# Altium footprint library 3.22-杂项.PcbLib: 199 footprints (part 11 of 15) (continued)
## TAPE244-15 [mil] "[ PCBѧϰȺ514746572 ]"
pads (244):
  oval 75x8 smd: 1(-562.5,299.5) 2(-562.5,289.5) 3(-562.5,279.5) 4(-562.5,269.5) 5(-562.5,259.5) 6(-562.5,249.5) 7(-562.5,239.5) 8(-562.5,229.5) 9(-562.5,219.5) 10(-562.5,209.5) 11(-562.5,199.5) 12(-562.5,189.5) 13(-562.5,179.5) 14(-562.5,169.5) 15(-562.5,159.5) 16(-562.5,149.5) 17(-562.5,139.5) 18(-562.5,129.5) 19(-562.5,119.5) 20(-562.5,109.5) 21(-562.5,99.5) 22(-562.5,89.5) 23(-562.5,79.5) 24(-562.5,69.5) 25(-562.5,59.5) 26(-562.5,49.5) 27(-562.5,39.5) 28(-562.5,29.5) 29(-562.5,19.5) 30(-562.5,9.5) 31(-562.5,-0.5) 32(-562.5,-10.5) 33(-562.5,-20.5) 34(-562.5,-30.5) 35(-562.5,-40.5) 36(-562.5,-50.5) 37(-562.5,-60.5) 38(-562.5,-70.5) 39(-562.5,-80.5) 40(-562.5,-90.5) 41(-562.5,-100.5) 42(-562.5,-110.5) 43(-562.5,-120.5) 44(-562.5,-130.5) 45(-562.5,-140.5) 46(-562.5,-150.5) 47(-562.5,-160.5) 48(-562.5,-170.5) 49(-562.5,-180.5) 50(-562.5,-190.5) 51(-562.5,-200.5) 52(-562.5,-210.5) 53(-562.5,-220.5) 54(-562.5,-230.5) 55(-562.5,-240.5) 56(-562.5,-250.5) 57(-562.5,-260.5) 58(-562.5,-270.5) 59(-562.5,-280.5) 60(-562.5,-290.5) 61(-562.5,-300.5) 123(562.5,-300.5) 124(562.5,-290.5) 125(562.5,-280.5) 126(562.5,-270.5) 127(562.5,-260.5) 128(562.5,-250.5) 129(562.5,-240.5) 130(562.5,-230.5) 131(562.5,-220.5) 132(562.5,-210.5) 133(562.5,-200.5) 134(562.5,-190.5) 135(562.5,-180.5) 136(562.5,-170.5) 137(562.5,-160.5) 138(562.5,-150.5) 139(562.5,-140.5) 140(562.5,-130.5) 141(562.5,-120.5) 142(562.5,-110.5) 143(562.5,-100.5) 144(562.5,-90.5) 145(562.5,-80.5) 146(562.5,-70.5) 147(562.5,-60.5) 148(562.5,-50.5) 149(562.5,-40.5) 150(562.5,-30.5) 151(562.5,-20.5) 152(562.5,-10.5) 153(562.5,-0.5) 154(562.5,9.5) 155(562.5,19.5) 156(562.5,29.5) 157(562.5,39.5) 158(562.5,49.5) 159(562.5,59.5) 160(562.5,69.5) 161(562.5,79.5) 162(562.5,89.5) 163(562.5,99.5) 164(562.5,109.5) 165(562.5,119.5) 166(562.5,129.5) 167(562.5,139.5) 168(562.5,149.5) 169(562.5,159.5) 170(562.5,169.5) 171(562.5,179.5) 172(562.5,189.5) 173(562.5,199.5) 174(562.5,209.5) 175(562.5,219.5) 176(562.5,229.5) 177(562.5,239.5) 178(562.5,249.5) 179(562.5,259.5) 180(562.5,269.5) 181(562.5,279.5) 182(562.5,289.5) 183(562.5,299.5)
  oval 8x75 smd: 62(-299.5,-562.5) 63(-289.5,-562.5) 64(-279.5,-562.5) 65(-269.5,-562.5) 66(-259.5,-562.5) 67(-249.5,-562.5) 68(-239.5,-562.5) 69(-229.5,-562.5) 70(-219.5,-562.5) 71(-209.5,-562.5) 72(-199.5,-562.5) 73(-189.5,-562.5) 74(-179.5,-562.5) 75(-169.5,-562.5) 76(-159.5,-562.5) 77(-149.5,-562.5) 78(-139.5,-562.5) 79(-129.5,-562.5) 80(-119.5,-562.5) 81(-109.5,-562.5) 82(-99.5,-562.5) 83(-89.5,-562.5) 84(-79.5,-562.5) 85(-69.5,-562.5) 86(-59.5,-562.5) 87(-49.5,-562.5) 88(-39.5,-562.5) 89(-29.5,-562.5) 90(-19.5,-562.5) 91(-9.5,-562.5) 92(0.5,-562.5) 93(10.5,-562.5) 94(20.5,-562.5) 95(30.5,-562.5) 96(40.5,-562.5) 97(50.5,-562.5) 98(60.5,-562.5) 99(70.5,-562.5) 100(80.5,-562.5) 101(90.5,-562.5) 102(100.5,-562.5) 103(110.5,-562.5) 104(120.5,-562.5) 105(130.5,-562.5) 106(140.5,-562.5) 107(150.5,-562.5) 108(160.5,-562.5) 109(170.5,-562.5) 110(180.5,-562.5) 111(190.5,-562.5) 112(200.5,-562.5) 113(210.5,-562.5) 114(220.5,-562.5) 115(230.5,-562.5) 116(240.5,-562.5) 117(250.5,-562.5) 118(260.5,-562.5) 119(270.5,-562.5) 120(280.5,-562.5) 121(290.5,-562.5) 122(300.5,-562.5) 184(300.5,562.5) 185(290.5,562.5) 186(280.5,562.5) 187(270.5,562.5) 188(260.5,562.5) 189(250.5,562.5) 190(240.5,562.5) 191(230.5,562.5) 192(220.5,562.5) 193(210.5,562.5) 194(200.5,562.5) 195(190.5,562.5) 196(180.5,562.5) 197(170.5,562.5) 198(160.5,562.5) 199(150.5,562.5) 200(140.5,562.5) 201(130.5,562.5) 202(120.5,562.5) 203(110.5,562.5) 204(100.5,562.5) 205(90.5,562.5) 206(80.5,562.5) 207(70.5,562.5) 208(60.5,562.5) 209(50.5,562.5) 210(40.5,562.5) 211(30.5,562.5) 212(20.5,562.5) 213(10.5,562.5) 214(0.5,562.5) 215(-9.5,562.5) 216(-19.5,562.5) 217(-29.5,562.5) 218(-39.5,562.5) 219(-49.5,562.5) 220(-59.5,562.5) 221(-69.5,562.5) 222(-79.5,562.5) 223(-89.5,562.5) 224(-99.5,562.5) 225(-109.5,562.5) 226(-119.5,562.5) 227(-129.5,562.5) 228(-139.5,562.5) 229(-149.5,562.5) 230(-159.5,562.5) 231(-169.5,562.5) 232(-179.5,562.5) 233(-189.5,562.5) 234(-199.5,562.5) 235(-209.5,562.5) 236(-219.5,562.5) 237(-229.5,562.5) 238(-239.5,562.5) 239(-249.5,562.5) 240(-259.5,562.5) 241(-269.5,562.5) 242(-279.5,562.5) 243(-289.5,562.5) 244(-299.5,562.5)

## TAPE244-20 [mil] "[ PCBѧϰȺ514746572 ]"
pads (244):
  oval 75x12 smd: 1(-712.5,599.5) 2(-712.5,579.5) 3(-712.5,559.5) 4(-712.5,539.5) 5(-712.5,519.5) 6(-712.5,499.5) 7(-712.5,479.5) 8(-712.5,459.5) 9(-712.5,439.5) 10(-712.5,419.5) 11(-712.5,399.5) 12(-712.5,379.5) 13(-712.5,359.5) 14(-712.5,339.5) 15(-712.5,319.5) 16(-712.5,299.5) 17(-712.5,279.5) 18(-712.5,259.5) 19(-712.5,239.5) 20(-712.5,219.5) 21(-712.5,199.5) 22(-712.5,179.5) 23(-712.5,159.5) 24(-712.5,139.5) 25(-712.5,119.5) 26(-712.5,99.5) 27(-712.5,79.5) 28(-712.5,59.5) 29(-712.5,39.5) 30(-712.5,19.5) 31(-712.5,-0.5) 32(-712.5,-20.5) 33(-712.5,-40.5) 34(-712.5,-60.5) 35(-712.5,-80.5) 36(-712.5,-100.5) 37(-712.5,-120.5) 38(-712.5,-140.5) 39(-712.5,-160.5) 40(-712.5,-180.5) 41(-712.5,-200.5) 42(-712.5,-220.5) 43(-712.5,-240.5) 44(-712.5,-260.5) 45(-712.5,-280.5) 46(-712.5,-300.5) 47(-712.5,-320.5) 48(-712.5,-340.5) 49(-712.5,-360.5) 50(-712.5,-380.5) 51(-712.5,-400.5) 52(-712.5,-420.5) 53(-712.5,-440.5) 54(-712.5,-460.5) 55(-712.5,-480.5) 56(-712.5,-500.5) 57(-712.5,-520.5) 58(-712.5,-540.5) 59(-712.5,-560.5) 60(-712.5,-580.5) 61(-712.5,-600.5) 123(712.5,-600.5) 124(712.5,-580.5) 125(712.5,-560.5) 126(712.5,-540.5) 127(712.5,-520.5) 128(712.5,-500.5) 129(712.5,-480.5) 130(712.5,-460.5) 131(712.5,-440.5) 132(712.5,-420.5) 133(712.5,-400.5) 134(712.5,-380.5) 135(712.5,-360.5) 136(712.5,-340.5) 137(712.5,-320.5) 138(712.5,-300.5) 139(712.5,-280.5) 140(712.5,-260.5) 141(712.5,-240.5) 142(712.5,-220.5) 143(712.5,-200.5) 144(712.5,-180.5) 145(712.5,-160.5) 146(712.5,-140.5) 147(712.5,-120.5) 148(712.5,-100.5) 149(712.5,-80.5) 150(712.5,-60.5) 151(712.5,-40.5) 152(712.5,-20.5) 153(712.5,-0.5) 154(712.5,19.5) 155(712.5,39.5) 156(712.5,59.5) 157(712.5,79.5) 158(712.5,99.5) 159(712.5,119.5) 160(712.5,139.5) 161(712.5,159.5) 162(712.5,179.5) 163(712.5,199.5) 164(712.5,219.5) 165(712.5,239.5) 166(712.5,259.5) 167(712.5,279.5) 168(712.5,299.5) 169(712.5,319.5) 170(712.5,339.5) 171(712.5,359.5) 172(712.5,379.5) 173(712.5,399.5) 174(712.5,419.5) 175(712.5,439.5) 176(712.5,459.5) 177(712.5,479.5) 178(712.5,499.5) 179(712.5,519.5) 180(712.5,539.5) 181(712.5,559.5) 182(712.5,579.5) 183(712.5,599.5)
  oval 12x75 smd: 62(-599.5,-712.5) 63(-579.5,-712.5) 64(-559.5,-712.5) 65(-539.5,-712.5) 66(-519.5,-712.5) 67(-499.5,-712.5) 68(-479.5,-712.5) 69(-459.5,-712.5) 70(-439.5,-712.5) 71(-419.5,-712.5) 72(-399.5,-712.5) 73(-379.5,-712.5) 74(-359.5,-712.5) 75(-339.5,-712.5) 76(-319.5,-712.5) 77(-299.5,-712.5) 78(-279.5,-712.5) 79(-259.5,-712.5) 80(-239.5,-712.5) 81(-219.5,-712.5) 82(-199.5,-712.5) 83(-179.5,-712.5) 84(-159.5,-712.5) 85(-139.5,-712.5) 86(-119.5,-712.5) 87(-99.5,-712.5) 88(-79.5,-712.5) 89(-59.5,-712.5) 90(-39.5,-712.5) 91(-19.5,-712.5) 92(0.5,-712.5) 93(20.5,-712.5) 94(40.5,-712.5) 95(60.5,-712.5) 96(80.5,-712.5) 97(100.5,-712.5) 98(120.5,-712.5) 99(140.5,-712.5) 100(160.5,-712.5) 101(180.5,-712.5) 102(200.5,-712.5) 103(220.5,-712.5) 104(240.5,-712.5) 105(260.5,-712.5) 106(280.5,-712.5) 107(300.5,-712.5) 108(320.5,-712.5) 109(340.5,-712.5) 110(360.5,-712.5) 111(380.5,-712.5) 112(400.5,-712.5) 113(420.5,-712.5) 114(440.5,-712.5) 115(460.5,-712.5) 116(480.5,-712.5) 117(500.5,-712.5) 118(520.5,-712.5) 119(540.5,-712.5) 120(560.5,-712.5) 121(580.5,-712.5) 122(600.5,-712.5) 184(600.5,712.5) 185(580.5,712.5) 186(560.5,712.5) 187(540.5,712.5) 188(520.5,712.5) 189(500.5,712.5) 190(480.5,712.5) 191(460.5,712.5) 192(440.5,712.5) 193(420.5,712.5) 194(400.5,712.5) 195(380.5,712.5) 196(360.5,712.5) 197(340.5,712.5) 198(320.5,712.5) 199(300.5,712.5) 200(280.5,712.5) 201(260.5,712.5) 202(240.5,712.5) 203(220.5,712.5) 204(200.5,712.5) 205(180.5,712.5) 206(160.5,712.5) 207(140.5,712.5) 208(120.5,712.5) 209(100.5,712.5) 210(80.5,712.5) 211(60.5,712.5) 212(40.5,712.5) 213(20.5,712.5) 214(0.5,712.5) 215(-19.5,712.5) 216(-39.5,712.5) 217(-59.5,712.5) 218(-79.5,712.5) 219(-99.5,712.5) 220(-119.5,712.5) 221(-139.5,712.5) 222(-159.5,712.5) 223(-179.5,712.5) 224(-199.5,712.5) 225(-219.5,712.5) 226(-239.5,712.5) 227(-259.5,712.5) 228(-279.5,712.5) 229(-299.5,712.5) 230(-319.5,712.5) 231(-339.5,712.5) 232(-359.5,712.5) 233(-379.5,712.5) 234(-399.5,712.5) 235(-419.5,712.5) 236(-439.5,712.5) 237(-459.5,712.5) 238(-479.5,712.5) 239(-499.5,712.5) 240(-519.5,712.5) 241(-539.5,712.5) 242(-559.5,712.5) 243(-579.5,712.5) 244(-599.5,712.5)

## TAPE284-10 [mil] "[ PCBѧϰȺ514746572 ]"
pads (284):
  oval 75x5 smd: 1(-462.5,349.5) 2(-462.5,339.5) 3(-462.5,329.5) 4(-462.5,319.5) 5(-462.5,309.5) 6(-462.5,299.5) 7(-462.5,289.5) 8(-462.5,279.5) 9(-462.5,269.5) 10(-462.5,259.5) 11(-462.5,249.5) 12(-462.5,239.5) 13(-462.5,229.5) 14(-462.5,219.5) 15(-462.5,209.5) 16(-462.5,199.5) 17(-462.5,189.5) 18(-462.5,179.5) 19(-462.5,169.5) 20(-462.5,159.5) 21(-462.5,149.5) 22(-462.5,139.5) 23(-462.5,129.5) 24(-462.5,119.5) 25(-462.5,109.5) 26(-462.5,99.5) 27(-462.5,89.5) 28(-462.5,79.5) 29(-462.5,69.5) 30(-462.5,59.5) 31(-462.5,49.5) 32(-462.5,39.5) 33(-462.5,29.5) 34(-462.5,19.5) 35(-462.5,9.5) 36(-462.5,-0.5) 37(-462.5,-10.5) 38(-462.5,-20.5) 39(-462.5,-30.5) 40(-462.5,-40.5) 41(-462.5,-50.5) 42(-462.5,-60.5) 43(-462.5,-70.5) 44(-462.5,-80.5) 45(-462.5,-90.5) 46(-462.5,-100.5) 47(-462.5,-110.5) 48(-462.5,-120.5) 49(-462.5,-130.5) 50(-462.5,-140.5) 51(-462.5,-150.5) 52(-462.5,-160.5) 53(-462.5,-170.5) 54(-462.5,-180.5) 55(-462.5,-190.5) 56(-462.5,-200.5) 57(-462.5,-210.5) 58(-462.5,-220.5) 59(-462.5,-230.5) 60(-462.5,-240.5) 61(-462.5,-250.5) 62(-462.5,-260.5) 63(-462.5,-270.5) 64(-462.5,-280.5) 65(-462.5,-290.5) 66(-462.5,-300.5) 67(-462.5,-310.5) 68(-462.5,-320.5) 69(-462.5,-330.5) 70(-462.5,-340.5) 71(-462.5,-350.5) 143(462.5,-350.5) 144(462.5,-340.5) 145(462.5,-330.5) 146(462.5,-320.5) 147(462.5,-310.5) 148(462.5,-300.5) 149(462.5,-290.5) 150(462.5,-280.5) 151(462.5,-270.5) 152(462.5,-260.5) 153(462.5,-250.5) 154(462.5,-240.5) 155(462.5,-230.5) 156(462.5,-220.5) 157(462.5,-210.5) 158(462.5,-200.5) 159(462.5,-190.5) 160(462.5,-180.5) 161(462.5,-170.5) 162(462.5,-160.5) 163(462.5,-150.5) 164(462.5,-140.5) 165(462.5,-130.5) 166(462.5,-120.5) 167(462.5,-110.5) 168(462.5,-100.5) 169(462.5,-90.5) 170(462.5,-80.5) 171(462.5,-70.5) 172(462.5,-60.5) 173(462.5,-50.5) 174(462.5,-40.5) 175(462.5,-30.5) 176(462.5,-20.5) 177(462.5,-10.5) 178(462.5,-0.5) 179(462.5,9.5) 180(462.5,19.5) 181(462.5,29.5) 182(462.5,39.5) 183(462.5,49.5) 184(462.5,59.5) 185(462.5,69.5) 186(462.5,79.5) 187(462.5,89.5) 188(462.5,99.5) 189(462.5,109.5) 190(462.5,119.5) 191(462.5,129.5) 192(462.5,139.5) 193(462.5,149.5) 194(462.5,159.5) 195(462.5,169.5) 196(462.5,179.5) 197(462.5,189.5) 198(462.5,199.5) 199(462.5,209.5) 200(462.5,219.5) 201(462.5,229.5) 202(462.5,239.5) 203(462.5,249.5) 204(462.5,259.5) 205(462.5,269.5) 206(462.5,279.5) 207(462.5,289.5) 208(462.5,299.5) 209(462.5,309.5) 210(462.5,319.5) 211(462.5,329.5) 212(462.5,339.5) 213(462.5,349.5)
  oval 5x75 smd: 72(-349.5,-462.5) 73(-339.5,-462.5) 74(-329.5,-462.5) 75(-319.5,-462.5) 76(-309.5,-462.5) 77(-299.5,-462.5) 78(-289.5,-462.5) 79(-279.5,-462.5) 80(-269.5,-462.5) 81(-259.5,-462.5) 82(-249.5,-462.5) 83(-239.5,-462.5) 84(-229.5,-462.5) 85(-219.5,-462.5) 86(-209.5,-462.5) 87(-199.5,-462.5) 88(-189.5,-462.5) 89(-179.5,-462.5) 90(-169.5,-462.5) 91(-159.5,-462.5) 92(-149.5,-462.5) 93(-139.5,-462.5) 94(-129.5,-462.5) 95(-119.5,-462.5) 96(-109.5,-462.5) 97(-99.5,-462.5) 98(-89.5,-462.5) 99(-79.5,-462.5) 100(-69.5,-462.5) 101(-59.5,-462.5) 102(-49.5,-462.5) 103(-39.5,-462.5) 104(-29.5,-462.5) 105(-19.5,-462.5) 106(-9.5,-462.5) 107(0.5,-462.5) 108(10.5,-462.5) 109(20.5,-462.5) 110(30.5,-462.5) 111(40.5,-462.5) 112(50.5,-462.5) 113(60.5,-462.5) 114(70.5,-462.5) 115(80.5,-462.5) 116(90.5,-462.5) 117(100.5,-462.5) 118(110.5,-462.5) 119(120.5,-462.5) 120(130.5,-462.5) 121(140.5,-462.5) 122(150.5,-462.5) 123(160.5,-462.5) 124(170.5,-462.5) 125(180.5,-462.5) 126(190.5,-462.5) 127(200.5,-462.5) 128(210.5,-462.5) 129(220.5,-462.5) 130(230.5,-462.5) 131(240.5,-462.5) 132(250.5,-462.5) 133(260.5,-462.5) 134(270.5,-462.5) 135(280.5,-462.5) 136(290.5,-462.5) 137(300.5,-462.5) 138(310.5,-462.5) 139(320.5,-462.5) 140(330.5,-462.5) 141(340.5,-462.5) 142(350.5,-462.5) 214(350.5,462.5) 215(340.5,462.5) 216(330.5,462.5) 217(320.5,462.5) 218(310.5,462.5) 219(300.5,462.5) 220(290.5,462.5) 221(280.5,462.5) 222(270.5,462.5) 223(260.5,462.5) 224(250.5,462.5) 225(240.5,462.5) 226(230.5,462.5) 227(220.5,462.5) 228(210.5,462.5) 229(200.5,462.5) 230(190.5,462.5) 231(180.5,462.5) 232(170.5,462.5) 233(160.5,462.5) 234(150.5,462.5) 235(140.5,462.5) 236(130.5,462.5) 237(120.5,462.5) 238(110.5,462.5) 239(100.5,462.5) 240(90.5,462.5) 241(80.5,462.5) 242(70.5,462.5) 243(60.5,462.5) 244(50.5,462.5) 245(40.5,462.5) 246(30.5,462.5) 247(20.5,462.5) 248(10.5,462.5) 249(0.5,462.5) 250(-9.5,462.5) 251(-19.5,462.5) 252(-29.5,462.5) 253(-39.5,462.5) 254(-49.5,462.5) 255(-59.5,462.5) 256(-69.5,462.5) 257(-79.5,462.5) 258(-89.5,462.5) 259(-99.5,462.5) 260(-109.5,462.5) 261(-119.5,462.5) 262(-129.5,462.5) 263(-139.5,462.5) 264(-149.5,462.5) 265(-159.5,462.5) 266(-169.5,462.5) 267(-179.5,462.5) 268(-189.5,462.5) 269(-199.5,462.5) 270(-209.5,462.5) 271(-219.5,462.5) 272(-229.5,462.5) 273(-239.5,462.5) 274(-249.5,462.5) 275(-259.5,462.5) 276(-269.5,462.5) 277(-279.5,462.5) 278(-289.5,462.5) 279(-299.5,462.5) 280(-309.5,462.5) 281(-319.5,462.5) 282(-329.5,462.5) 283(-339.5,462.5) 284(-349.5,462.5)

## TAPE284-20 [mil] "[ PCBѧϰȺ514746572 ]"
pads (284):
  oval 75x12 smd: 1(-812.5,699.5) 2(-812.5,679.5) 3(-812.5,659.5) 4(-812.5,639.5) 5(-812.5,619.5) 6(-812.5,599.5) 7(-812.5,579.5) 8(-812.5,559.5) 9(-812.5,539.5) 10(-812.5,519.5) 11(-812.5,499.5) 12(-812.5,479.5) 13(-812.5,459.5) 14(-812.5,439.5) 15(-812.5,419.5) 16(-812.5,399.5) 17(-812.5,379.5) 18(-812.5,359.5) 19(-812.5,339.5) 20(-812.5,319.5) 21(-812.5,299.5) 22(-812.5,279.5) 23(-812.5,259.5) 24(-812.5,239.5) 25(-812.5,219.5) 26(-812.5,199.5) 27(-812.5,179.5) 28(-812.5,159.5) 29(-812.5,139.5) 30(-812.5,119.5) 31(-812.5,99.5) 32(-812.5,79.5) 33(-812.5,59.5) 34(-812.5,39.5) 35(-812.5,19.5) 36(-812.5,-0.5) 37(-812.5,-20.5) 38(-812.5,-40.5) 39(-812.5,-60.5) 40(-812.5,-80.5) 41(-812.5,-100.5) 42(-812.5,-120.5) 43(-812.5,-140.5) 44(-812.5,-160.5) 45(-812.5,-180.5) 46(-812.5,-200.5) 47(-812.5,-220.5) 48(-812.5,-240.5) 49(-812.5,-260.5) 50(-812.5,-280.5) 51(-812.5,-300.5) 52(-812.5,-320.5) 53(-812.5,-340.5) 54(-812.5,-360.5) 55(-812.5,-380.5) 56(-812.5,-400.5) 57(-812.5,-420.5) 58(-812.5,-440.5) 59(-812.5,-460.5) 60(-812.5,-480.5) 61(-812.5,-500.5) 62(-812.5,-520.5) 63(-812.5,-540.5) 64(-812.5,-560.5) 65(-812.5,-580.5) 66(-812.5,-600.5) 67(-812.5,-620.5) 68(-812.5,-640.5) 69(-812.5,-660.5) 70(-812.5,-680.5) 71(-812.5,-700.5) 143(812.5,-700.5) 144(812.5,-680.5) 145(812.5,-660.5) 146(812.5,-640.5) 147(812.5,-620.5) 148(812.5,-600.5) 149(812.5,-580.5) 150(812.5,-560.5) 151(812.5,-540.5) 152(812.5,-520.5) 153(812.5,-500.5) 154(812.5,-480.5) 155(812.5,-460.5) 156(812.5,-440.5) 157(812.5,-420.5) 158(812.5,-400.5) 159(812.5,-380.5) 160(812.5,-360.5) 161(812.5,-340.5) 162(812.5,-320.5) 163(812.5,-300.5) 164(812.5,-280.5) 165(812.5,-260.5) 166(812.5,-240.5) 167(812.5,-220.5) 168(812.5,-200.5) 169(812.5,-180.5) 170(812.5,-160.5) 171(812.5,-140.5) 172(812.5,-120.5) 173(812.5,-100.5) 174(812.5,-80.5) 175(812.5,-60.5) 176(812.5,-40.5) 177(812.5,-20.5) 178(812.5,-0.5) 179(812.5,19.5) 180(812.5,39.5) 181(812.5,59.5) 182(812.5,79.5) 183(812.5,99.5) 184(812.5,119.5) 185(812.5,139.5) 186(812.5,159.5) 187(812.5,179.5) 188(812.5,199.5) 189(812.5,219.5) 190(812.5,239.5) 191(812.5,259.5) 192(812.5,279.5) 193(812.5,299.5) 194(812.5,319.5) 195(812.5,339.5) 196(812.5,359.5) 197(812.5,379.5) 198(812.5,399.5) 199(812.5,419.5) 200(812.5,439.5) 201(812.5,459.5) 202(812.5,479.5) 203(812.5,499.5) 204(812.5,519.5) 205(812.5,539.5) 206(812.5,559.5) 207(812.5,579.5) 208(812.5,599.5) 209(812.5,619.5) 210(812.5,639.5) 211(812.5,659.5) 212(812.5,679.5) 213(812.5,699.5)
  oval 12x75 smd: 72(-699.5,-812.5) 73(-679.5,-812.5) 74(-659.5,-812.5) 75(-639.5,-812.5) 76(-619.5,-812.5) 77(-599.5,-812.5) 78(-579.5,-812.5) 79(-559.5,-812.5) 80(-539.5,-812.5) 81(-519.5,-812.5) 82(-499.5,-812.5) 83(-479.5,-812.5) 84(-459.5,-812.5) 85(-439.5,-812.5) 86(-419.5,-812.5) 87(-399.5,-812.5) 88(-379.5,-812.5) 89(-359.5,-812.5) 90(-339.5,-812.5) 91(-319.5,-812.5) 92(-299.5,-812.5) 93(-279.5,-812.5) 94(-259.5,-812.5) 95(-239.5,-812.5) 96(-219.5,-812.5) 97(-199.5,-812.5) 98(-179.5,-812.5) 99(-159.5,-812.5) 100(-139.5,-812.5) 101(-119.5,-812.5) 102(-99.5,-812.5) 103(-79.5,-812.5) 104(-59.5,-812.5) 105(-39.5,-812.5) 106(-19.5,-812.5) 107(0.5,-812.5) 108(20.5,-812.5) 109(40.5,-812.5) 110(60.5,-812.5) 111(80.5,-812.5) 112(100.5,-812.5) 113(120.5,-812.5) 114(140.5,-812.5) 115(160.5,-812.5) 116(180.5,-812.5) 117(200.5,-812.5) 118(220.5,-812.5) 119(240.5,-812.5) 120(260.5,-812.5) 121(280.5,-812.5) 122(300.5,-812.5) 123(320.5,-812.5) 124(340.5,-812.5) 125(360.5,-812.5) 126(380.5,-812.5) 127(400.5,-812.5) 128(420.5,-812.5) 129(440.5,-812.5) 130(460.5,-812.5) 131(480.5,-812.5) 132(500.5,-812.5) 133(520.5,-812.5) 134(540.5,-812.5) 135(560.5,-812.5) 136(580.5,-812.5) 137(600.5,-812.5) 138(620.5,-812.5) 139(640.5,-812.5) 140(660.5,-812.5) 141(680.5,-812.5) 142(700.5,-812.5) 214(700.5,812.5) 215(680.5,812.5) 216(660.5,812.5) 217(640.5,812.5) 218(620.5,812.5) 219(600.5,812.5) 220(580.5,812.5) 221(560.5,812.5) 222(540.5,812.5) 223(520.5,812.5) 224(500.5,812.5) 225(480.5,812.5) 226(460.5,812.5) 227(440.5,812.5) 228(420.5,812.5) 229(400.5,812.5) 230(380.5,812.5) 231(360.5,812.5) 232(340.5,812.5) 233(320.5,812.5) 234(300.5,812.5) 235(280.5,812.5) 236(260.5,812.5) 237(240.5,812.5) 238(220.5,812.5) 239(200.5,812.5) 240(180.5,812.5) 241(160.5,812.5) 242(140.5,812.5) 243(120.5,812.5) 244(100.5,812.5) 245(80.5,812.5) 246(60.5,812.5) 247(40.5,812.5) 248(20.5,812.5) 249(0.5,812.5) 250(-19.5,812.5) 251(-39.5,812.5) 252(-59.5,812.5) 253(-79.5,812.5) 254(-99.5,812.5) 255(-119.5,812.5) 256(-139.5,812.5) 257(-159.5,812.5) 258(-179.5,812.5) 259(-199.5,812.5) 260(-219.5,812.5) 261(-239.5,812.5) 262(-259.5,812.5) 263(-279.5,812.5) 264(-299.5,812.5) 265(-319.5,812.5) 266(-339.5,812.5) 267(-359.5,812.5) 268(-379.5,812.5) 269(-399.5,812.5) 270(-419.5,812.5) 271(-439.5,812.5) 272(-459.5,812.5) 273(-479.5,812.5) 274(-499.5,812.5) 275(-519.5,812.5) 276(-539.5,812.5) 277(-559.5,812.5) 278(-579.5,812.5) 279(-599.5,812.5) 280(-619.5,812.5) 281(-639.5,812.5) 282(-659.5,812.5) 283(-679.5,812.5) 284(-699.5,812.5)

## TAPE324-15 [mil] "[ PCBѧϰȺ514746572 ]"
pads (324):
  oval 75x8 smd: 1(-712.5,599.5) 2(-712.5,584.5) 3(-712.5,569.5) 4(-712.5,554.5) 5(-712.5,539.5) 6(-712.5,524.5) 7(-712.5,509.5) 8(-712.5,494.5) 9(-712.5,479.5) 10(-712.5,464.5) 11(-712.5,449.5) 12(-712.5,434.5) 13(-712.5,419.5) 14(-712.5,404.5) 15(-712.5,389.5) 16(-712.5,374.5) 17(-712.5,359.5) 18(-712.5,344.5) 19(-712.5,329.5) 20(-712.5,314.5) 21(-712.5,299.5) 22(-712.5,284.5) 23(-712.5,269.5) 24(-712.5,254.5) 25(-712.5,239.5) 26(-712.5,224.5) 27(-712.5,209.5) 28(-712.5,194.5) 29(-712.5,179.5) 30(-712.5,164.5) 31(-712.5,149.5) 32(-712.5,134.5) 33(-712.5,119.5) 34(-712.5,104.5) 35(-712.5,89.5) 36(-712.5,74.5) 37(-712.5,59.5) 38(-712.5,44.5) 39(-712.5,29.5) 40(-712.5,14.5) 41(-712.5,-0.5) 42(-712.5,-15.5) 43(-712.5,-30.5) 44(-712.5,-45.5) 45(-712.5,-60.5) 46(-712.5,-75.5) 47(-712.5,-90.5) 48(-712.5,-105.5) 49(-712.5,-120.5) 50(-712.5,-135.5) 51(-712.5,-150.5) 52(-712.5,-165.5) 53(-712.5,-180.5) 54(-712.5,-195.5) 55(-712.5,-210.5) 56(-712.5,-225.5) 57(-712.5,-240.5) 58(-712.5,-255.5) 59(-712.5,-270.5) 60(-712.5,-285.5) 61(-712.5,-300.5) 62(-712.5,-315.5) 63(-712.5,-330.5) 64(-712.5,-345.5) 65(-712.5,-360.5) 66(-712.5,-375.5) 67(-712.5,-390.5) 68(-712.5,-405.5) 69(-712.5,-420.5) 70(-712.5,-435.5) 71(-712.5,-450.5) 72(-712.5,-465.5) 73(-712.5,-480.5) 74(-712.5,-495.5) 75(-712.5,-510.5) 76(-712.5,-525.5) 77(-712.5,-540.5) 78(-712.5,-555.5) 79(-712.5,-570.5) 80(-712.5,-585.5) 81(-712.5,-600.5) 163(712.5,-600.5) 164(712.5,-585.5) 165(712.5,-570.5) 166(712.5,-555.5) 167(712.5,-540.5) 168(712.5,-525.5) 169(712.5,-510.5) 170(712.5,-495.5) 171(712.5,-480.5) 172(712.5,-465.5) 173(712.5,-450.5) 174(712.5,-435.5) 175(712.5,-420.5) 176(712.5,-405.5) 177(712.5,-390.5) 178(712.5,-375.5) 179(712.5,-360.5) 180(712.5,-345.5) 181(712.5,-330.5) 182(712.5,-315.5) 183(712.5,-300.5) 184(712.5,-285.5) 185(712.5,-270.5) 186(712.5,-255.5) 187(712.5,-240.5) 188(712.5,-225.5) 189(712.5,-210.5) 190(712.5,-195.5) 191(712.5,-180.5) 192(712.5,-165.5) 193(712.5,-150.5) 194(712.5,-135.5) 195(712.5,-120.5) 196(712.5,-105.5) 197(712.5,-90.5) 198(712.5,-75.5) 199(712.5,-60.5) 200(712.5,-45.5) 201(712.5,-30.5) 202(712.5,-15.5) 203(712.5,-0.5) 204(712.5,14.5) 205(712.5,29.5) 206(712.5,44.5) 207(712.5,59.5) 208(712.5,74.5) 209(712.5,89.5) 210(712.5,104.5) 211(712.5,119.5) 212(712.5,134.5) 213(712.5,149.5) 214(712.5,164.5) 215(712.5,179.5) 216(712.5,194.5) 217(712.5,209.5) 218(712.5,224.5) 219(712.5,239.5) 220(712.5,254.5) 221(712.5,269.5) 222(712.5,284.5) 223(712.5,299.5) 224(712.5,314.5) 225(712.5,329.5) 226(712.5,344.5) 227(712.5,359.5) 228(712.5,374.5) 229(712.5,389.5) 230(712.5,404.5) 231(712.5,419.5) 232(712.5,434.5) 233(712.5,449.5) 234(712.5,464.5) 235(712.5,479.5) 236(712.5,494.5) 237(712.5,509.5) 238(712.5,524.5) 239(712.5,539.5) 240(712.5,554.5) 241(712.5,569.5) 242(712.5,584.5) 243(712.5,599.5)
  oval 8x75 smd: 82(-599.5,-712.5) 83(-584.5,-712.5) 84(-569.5,-712.5) 85(-554.5,-712.5) 86(-539.5,-712.5) 87(-524.5,-712.5) 88(-509.5,-712.5) 89(-494.5,-712.5) 90(-479.5,-712.5) 91(-464.5,-712.5) 92(-449.5,-712.5) 93(-434.5,-712.5) 94(-419.5,-712.5) 95(-404.5,-712.5) 96(-389.5,-712.5) 97(-374.5,-712.5) 98(-359.5,-712.5) 99(-344.5,-712.5) 100(-329.5,-712.5) 101(-314.5,-712.5) 102(-299.5,-712.5) 103(-284.5,-712.5) 104(-269.5,-712.5) 105(-254.5,-712.5) 106(-239.5,-712.5) 107(-224.5,-712.5) 108(-209.5,-712.5) 109(-194.5,-712.5) 110(-179.5,-712.5) 111(-164.5,-712.5) 112(-149.5,-712.5) 113(-134.5,-712.5) 114(-119.5,-712.5) 115(-104.5,-712.5) 116(-89.5,-712.5) 117(-74.5,-712.5) 118(-59.5,-712.5) 119(-44.5,-712.5) 120(-29.5,-712.5) 121(-14.5,-712.5) 122(0.5,-712.5) 123(15.5,-712.5) 124(30.5,-712.5) 125(45.5,-712.5) 126(60.5,-712.5) 127(75.5,-712.5) 128(90.5,-712.5) 129(105.5,-712.5) 130(120.5,-712.5) 131(135.5,-712.5) 132(150.5,-712.5) 133(165.5,-712.5) 134(180.5,-712.5) 135(195.5,-712.5) 136(210.5,-712.5) 137(225.5,-712.5) 138(240.5,-712.5) 139(255.5,-712.5) 140(270.5,-712.5) 141(285.5,-712.5) 142(300.5,-712.5) 143(315.5,-712.5) 144(330.5,-712.5) 145(345.5,-712.5) 146(360.5,-712.5) 147(375.5,-712.5) 148(390.5,-712.5) 149(405.5,-712.5) 150(420.5,-712.5) 151(435.5,-712.5) 152(450.5,-712.5) 153(465.5,-712.5) 154(480.5,-712.5) 155(495.5,-712.5) 156(510.5,-712.5) 157(525.5,-712.5) 158(540.5,-712.5) 159(555.5,-712.5) 160(570.5,-712.5) 161(585.5,-712.5) 162(600.5,-712.5) 244(600.5,712.5) 245(585.5,712.5) 246(570.5,712.5) 247(555.5,712.5) 248(540.5,712.5) 249(525.5,712.5) 250(510.5,712.5) 251(495.5,712.5) 252(480.5,712.5) 253(465.5,712.5) 254(450.5,712.5) 255(435.5,712.5) 256(420.5,712.5) 257(405.5,712.5) 258(390.5,712.5) 259(375.5,712.5) 260(360.5,712.5) 261(345.5,712.5) 262(330.5,712.5) 263(315.5,712.5) 264(300.5,712.5) 265(285.5,712.5) 266(270.5,712.5) 267(255.5,712.5) 268(240.5,712.5) 269(225.5,712.5) 270(210.5,712.5) 271(195.5,712.5) 272(180.5,712.5) 273(165.5,712.5) 274(150.5,712.5) 275(135.5,712.5) 276(120.5,712.5) 277(105.5,712.5) 278(90.5,712.5) 279(75.5,712.5) 280(60.5,712.5) 281(45.5,712.5) 282(30.5,712.5) 283(15.5,712.5) 284(0.5,712.5) 285(-14.5,712.5) 286(-29.5,712.5) 287(-44.5,712.5) 288(-59.5,712.5) 289(-74.5,712.5) 290(-89.5,712.5) 291(-104.5,712.5) 292(-119.5,712.5) 293(-134.5,712.5) 294(-149.5,712.5) 295(-164.5,712.5) 296(-179.5,712.5) 297(-194.5,712.5) 298(-209.5,712.5) 299(-224.5,712.5) 300(-239.5,712.5) 301(-254.5,712.5) 302(-269.5,712.5) 303(-284.5,712.5) 304(-299.5,712.5) 305(-314.5,712.5) 306(-329.5,712.5) 307(-344.5,712.5) 308(-359.5,712.5) 309(-374.5,712.5) 310(-389.5,712.5) 311(-404.5,712.5) 312(-419.5,712.5) 313(-434.5,712.5) 314(-449.5,712.5) 315(-464.5,712.5) 316(-479.5,712.5) 317(-494.5,712.5) 318(-509.5,712.5) 319(-524.5,712.5) 320(-539.5,712.5) 321(-554.5,712.5) 322(-569.5,712.5) 323(-584.5,712.5) 324(-599.5,712.5)